# Altium footprint library Design III PCB Library.PcbLib: 98 footprints (part 1 of 7)
Each footprint in its own frame and in the unit in brackets; x right, y up, seen from the top. Pads: shape width x height; smd on the part's side, far side on the other; paste and mask are expansions set on the pad; w line width, h text height; cw(c..) or ccw(c..) is an arc to the next point about the centre after c.
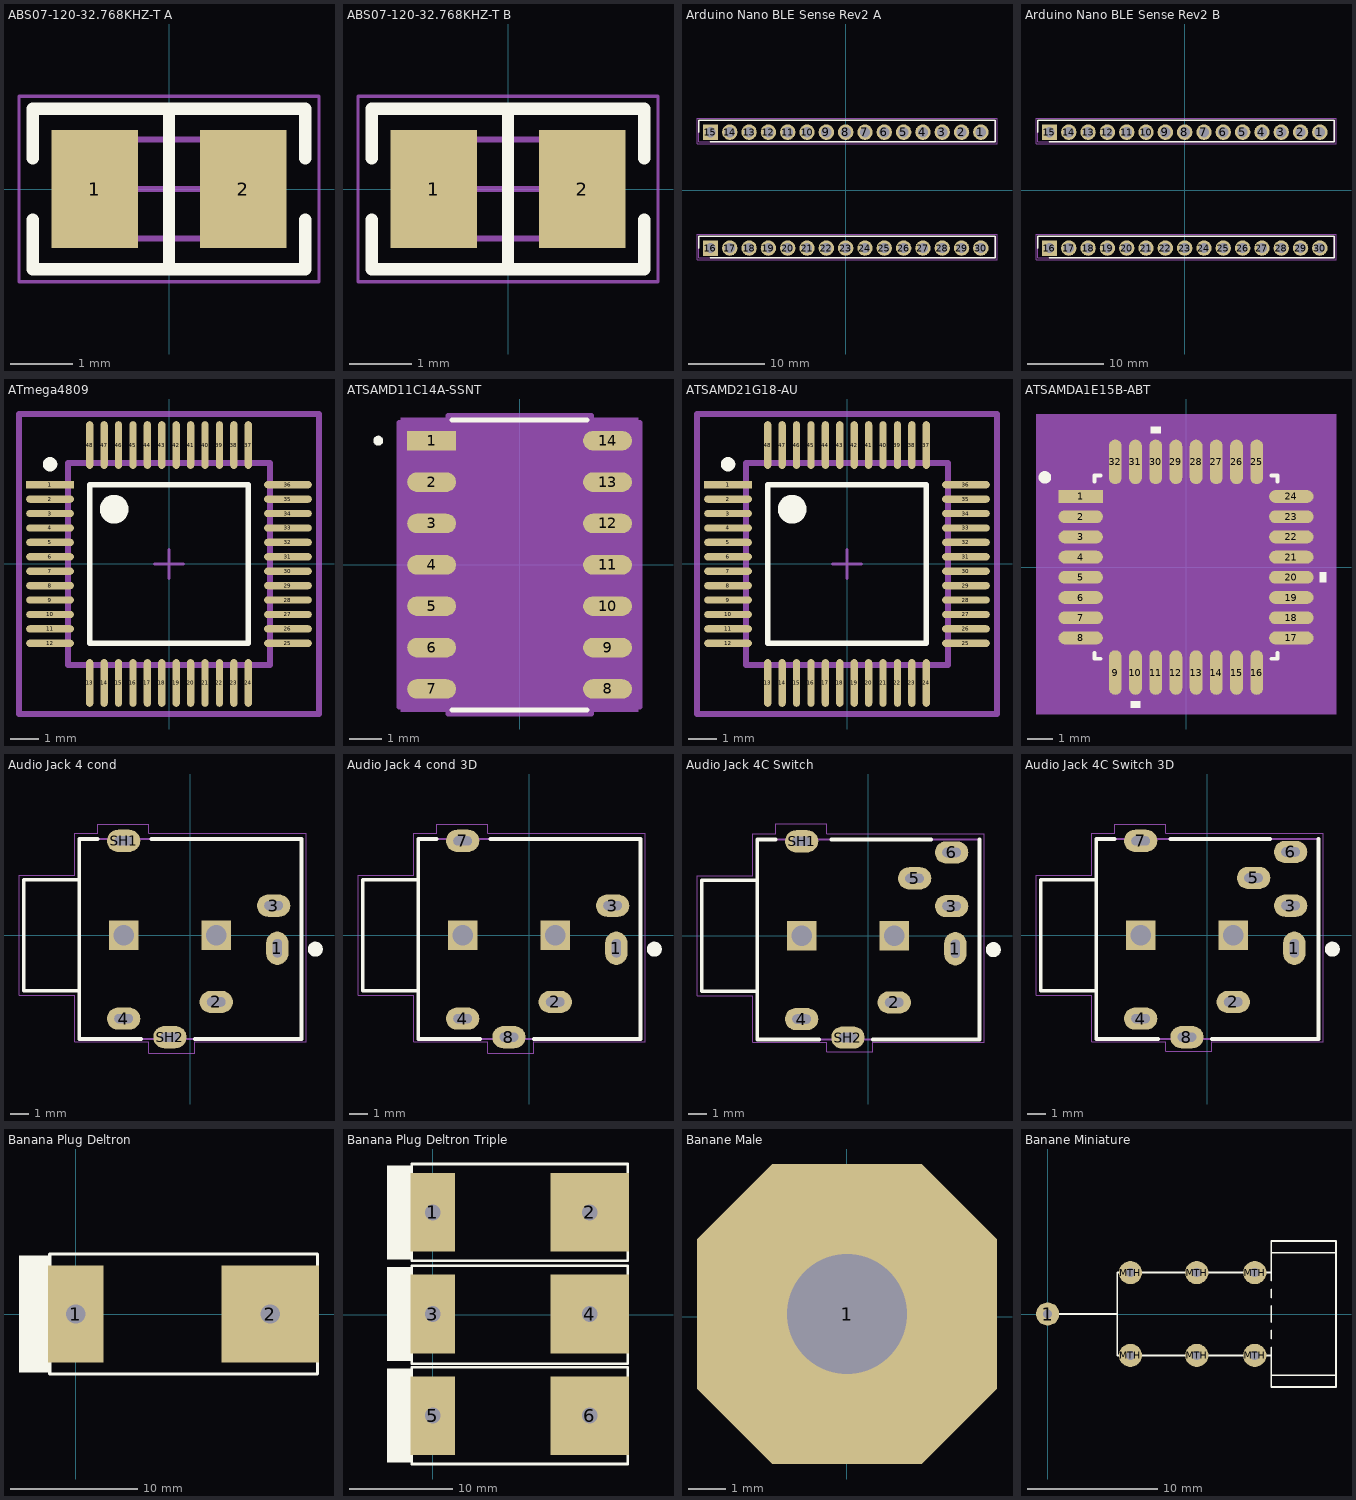
[diagram p0: the footprints below, top view; thin cyan lines are the x and y axes]

## ABS07-120-32.768KHZ-T A [mm] "32.768 kHz ±20ppm Crystal 6pF 55 kOhms 2-SMD, No Lead"
pads (2):
  rect 1.4x1.9 smd: 1(-1.2,0) 2(1.2,0)
Top Overlay:
  lines w0.2: -2.2,-0.5 -2.2,-1.3 2.2,-1.3 2.2,-0.5 ; -2.2,0.5 -2.2,1.3 2.2,1.3 2.2,0.5 ; 0,-1.3 0,1.3
Mechanical 13:
  lines w0.1: -1.65,-0.8 -1.65,0.8 1.65,0.8 1.65,-0.8 -1.65,-0.8
Mechanical 15:
  lines w0.05: -2.425,-1.5 2.425,-1.5 2.425,1.5 -2.425,1.5 -2.425,-1.5
  lines w0.1: -0.5,0 0.5,0 ; 0,-0.5 0,0.5
3D body "Crys_Abracon_ABS07-120-32_768KHZ-T_eec.STEP": height 0.25, standoff 0, extent -1.85,-1 1.85,1

## ABS07-120-32.768KHZ-T B [mm] "32.768 kHz ±20ppm Crystal 6pF 55 kOhms 2-SMD, No Lead"
pads (2):
  rect 1.4x1.9 smd: 1(-1.2,0) 2(1.2,0)
Top Overlay:
  lines w0.2: -2.2,-0.5 -2.2,-1.3 2.2,-1.3 2.2,-0.5 ; -2.2,0.5 -2.2,1.3 2.2,1.3 2.2,0.5 ; 0,-1.3 0,1.3
Mechanical 13:
  lines w0.1: -1.65,-0.8 1.65,-0.8 1.65,0.8 -1.65,0.8 -1.65,-0.8
Mechanical 15:
  lines w0.05: -2.425,-1.5 2.425,-1.5 2.425,1.5 -2.425,1.5 -2.425,-1.5
  lines w0.1: -0.5,0 0.5,0 ; 0,-0.5 0,0.5
3D body "Abracon ABS07.STEP": height 0.9, standoff 0, extent -1.625,-0.775 1.625,0.775

## Arduino Nano BLE Sense Rev2 A [mm] "ABX00069, nRF52840 64MHz, 256 KB SRAM, 1MB flash, 14 I/O pins, 8 Analog inputs"
pads (30):
  round 2.025 hole 1.35: 1(17.78,7.62) 2(15.24,7.62) 3(12.7,7.62) 4(10.16,7.62) 5(7.62,7.62) 6(5.08,7.62) 7(2.54,7.62) 8(0,7.62) 9(-2.54,7.62) 10(-5.08,7.62) 11(-7.62,7.62) 12(-10.16,7.62) 13(-12.7,7.62) 14(-15.24,7.62) 17(-15.24,-7.62) 18(-12.7,-7.62) 19(-10.16,-7.62) 20(-7.62,-7.62) 21(-5.08,-7.62) 22(-2.54,-7.62) 23(0,-7.62) 24(2.54,-7.62) 25(5.08,-7.62) 26(7.62,-7.62) 27(10.16,-7.62) 28(12.7,-7.62) 29(15.24,-7.62) 30(17.78,-7.62)
  rect 2.025x2.025 hole 1.35: 15(-17.78,7.62) 16(-17.78,-7.62)
Top Overlay:
  lines w0.2: -19.3,-7.62 -19.3,-6.05 19.65,-6.05 19.65,-8.89 -17.78,-8.89 ; -19.3,7.62 -19.3,9.19 19.65,9.19 19.65,6.35 -17.78,6.35
Mechanical 13:
  lines w0.1: -19.3,-8.89 -19.3,-6.05 19.65,-6.05 19.65,-8.89 -19.3,-8.89 ; -19.3,6.35 -19.3,9.19 19.65,9.19 19.65,6.35 -19.3,6.35
Mechanical 15:
  lines w0.05: -19.55,-9.14 -19.55,-5.8 19.9,-5.8 19.9,-9.14 -19.55,-9.14 ; -19.55,6.1 -19.55,9.44 19.9,9.44 19.9,6.1 -19.55,6.1
3D body "Arduino Nano BLE Sense Rev2.STEP": height 6.65, standoff -6.2, extent -23.06,-8.89 21.59,8.943

## Arduino Nano BLE Sense Rev2 B [mm] "ABX00069, nRF52840 64MHz, 256 KB SRAM, 1MB flash, 14 I/O pins, 8 Analog inputs"
pads (30):
  round 2.025 hole 1.35: 1(17.78,7.62) 2(15.24,7.62) 3(12.7,7.62) 4(10.16,7.62) 5(7.62,7.62) 6(5.08,7.62) 7(2.54,7.62) 8(0,7.62) 9(-2.54,7.62) 10(-5.08,7.62) 11(-7.62,7.62) 12(-10.16,7.62) 13(-12.7,7.62) 14(-15.24,7.62) 17(-15.24,-7.62) 18(-12.7,-7.62) 19(-10.16,-7.62) 20(-7.62,-7.62) 21(-5.08,-7.62) 22(-2.54,-7.62) 23(0,-7.62) 24(2.54,-7.62) 25(5.08,-7.62) 26(7.62,-7.62) 27(10.16,-7.62) 28(12.7,-7.62) 29(15.24,-7.62) 30(17.78,-7.62)
  rect 2.025x2.025 hole 1.35: 15(-17.78,7.62) 16(-17.78,-7.62)
Top Overlay:
  lines w0.2: -19.3,-7.62 -19.3,-6.05 19.65,-6.05 19.65,-8.89 -17.78,-8.89 ; -19.3,7.62 -19.3,9.19 19.65,9.19 19.65,6.35 -17.78,6.35
Mechanical 13:
  lines w0.1: -19.3,-8.89 -19.3,-6.05 19.65,-6.05 19.65,-8.89 -19.3,-8.89 ; -19.3,6.35 -19.3,9.19 19.65,9.19 19.65,6.35 -19.3,6.35
Mechanical 15:
  lines w0.05: -19.55,-9.14 -19.55,-5.8 19.9,-5.8 19.9,-9.14 -19.55,-9.14 ; -19.55,6.1 -19.55,9.44 19.9,9.44 19.9,6.1 -19.55,6.1

## ATmega4809 [mm] "AVR megaAVR® 0, Functional Safety (FuSa) Microcontroller IC 8-Bit 20MHz 48KB (24K x 16) FLASH 48-TQFP (7x7)"
pads (48):
  rect 1.655x0.252 smd paste+0 mask+0: 1(-4.125,2.75)
  rrect100% 1.655x0.252 smd paste+0 mask+0: 2(-4.125,2.25) 3(-4.125,1.75) 4(-4.125,1.25) 5(-4.125,0.75) 6(-4.125,0.25) 7(-4.125,-0.25) 8(-4.125,-0.75) 9(-4.125,-1.25) 10(-4.125,-1.75) 11(-4.125,-2.25) 12(-4.125,-2.75) 25(4.125,-2.75) 26(4.125,-2.25) 27(4.125,-1.75) 28(4.125,-1.25) 29(4.125,-0.75) 30(4.125,-0.25) 31(4.125,0.25) 32(4.125,0.75) 33(4.125,1.25) 34(4.125,1.75) 35(4.125,2.25) 36(4.125,2.75)
  rrect100% 0.252x1.655 smd paste+0 mask+0: 13(-2.75,-4.125) 14(-2.25,-4.125) 15(-1.75,-4.125) 16(-1.25,-4.125) 17(-0.75,-4.125) 18(-0.25,-4.125) 19(0.25,-4.125) 20(0.75,-4.125) 21(1.25,-4.125) 22(1.75,-4.125) 23(2.25,-4.125) 24(2.75,-4.125) 37(2.75,4.125) 38(2.25,4.125) 39(1.75,4.125) 40(1.25,4.125) 41(0.75,4.125) 42(0.25,4.125) 43(-0.25,4.125) 44(-0.75,4.125) 45(-1.25,4.125) 46(-1.75,4.125) 47(-2.25,4.125) 48(-2.75,4.125)
Top Overlay:
  circle w0.25: c-4.125,3.46 r0.125
  circle w0.5: c-1.9,1.9 r0.25
  lines w0.2: -2.75,-2.75 2.75,-2.75 2.75,2.75 -2.75,2.75 -2.75,-2.75
Top Assembly:
  lines w0.2: -5.203,-5.203 5.203,-5.203 5.203,5.203 -5.203,5.203 -5.203,-5.203
Top Courtyard:
  lines w0.2: -5.203,-5.203 5.203,-5.203 5.203,5.203 -5.203,5.203 -5.203,-5.203
Board:
  lines w0.2: -3.5,-3.5 3.5,-3.5 3.5,3.5 -3.5,3.5 -3.5,-3.5
Top Component Center:
  lines w0.1: -0.5,0 0.5,0 ; 0,-0.5 0,0.5
3D body "IC_Microchip_PIC24FJ256GA705-I-PT_eec.STEP": height 0.25, standoff 0, extent -5.203,-5.203 5.203,5.203

## ATSAMD11C14A-SSNT [mm] "ARM® Cortex®-M0+ SAM D11C Microcontroller IC 32-Bit Single-Core 48MHz 16KB (16K x 8) FLASH 14-SOIC"
pads (14):
  rect 1.5x0.6 smd paste+0 mask+0: 1(-2.7,3.81)
  oval 1.5x0.6 smd paste+0 mask+0: 2(-2.7,2.54) 3(-2.7,1.27) 4(-2.7,0) 5(-2.7,-1.27) 6(-2.7,-2.54) 7(-2.7,-3.81) 8(2.7,-3.81) 9(2.7,-2.54) 10(2.7,-1.27) 11(2.7,0) 12(2.7,1.27) 13(2.7,2.54) 14(2.7,3.81)
Top Overlay:
  circle w0.152: c-4.339,3.81 r0.076
  lines w0.152: -2.077,-4.452 2.077,-4.452 ; -2.077,4.452 2.077,4.452
Mechanical 5:
  region: 3.641,-4.516 -3.641,-4.516 -3.641,4.516 3.641,4.516
Mechanical 13:
  circle w0: c-1.696,3.81 r0.038
  lines w0: -0.305,4.325 ccw(c0,4.325) 0.305,4.325
  lines w0.025: -1.95,-4.325 1.95,-4.325 1.95,4.325 -1.95,4.325 -1.95,-4.325
Mechanical 15:
  region: -2.204,-4.364 -3.704,-4.364 -3.704,4.364 -2.204,4.364 -2.204,4.579 2.204,4.579 2.204,4.364 3.704,4.364 3.704,-4.364 2.204,-4.364 2.204,-4.579 -2.204,-4.579
  lines w0.152: -3.704,-4.364 -3.704,4.364 -2.204,4.364 -2.204,4.579 2.204,4.579 2.204,4.364 3.704,4.364 3.704,-4.364 2.204,-4.364 2.204,-4.579 -2.204,-4.579 -2.204,-4.364 -3.704,-4.364
3D body "SOIC14_SL_MCH.step": height 1.75, standoff 0, extent -3.1,-4.325 3.1,4.325

## ATSAMD21G18-AU [mm] "ARM® Cortex®-M0+ SAM D21G, Functional Safety (FuSa) Microcontroller IC 32-Bit Single-Core 48MHz 256KB (256K x 8) FLASH 48-TQFP (7x7)"
pads (48):
  rect 1.655x0.252 smd paste+0 mask+0: 1(-4.125,2.75)
  rrect100% 1.655x0.252 smd paste+0 mask+0: 2(-4.125,2.25) 3(-4.125,1.75) 4(-4.125,1.25) 5(-4.125,0.75) 6(-4.125,0.25) 7(-4.125,-0.25) 8(-4.125,-0.75) 9(-4.125,-1.25) 10(-4.125,-1.75) 11(-4.125,-2.25) 12(-4.125,-2.75) 25(4.125,-2.75) 26(4.125,-2.25) 27(4.125,-1.75) 28(4.125,-1.25) 29(4.125,-0.75) 30(4.125,-0.25) 31(4.125,0.25) 32(4.125,0.75) 33(4.125,1.25) 34(4.125,1.75) 35(4.125,2.25) 36(4.125,2.75)
  rrect100% 0.252x1.655 smd paste+0 mask+0: 13(-2.75,-4.125) 14(-2.25,-4.125) 15(-1.75,-4.125) 16(-1.25,-4.125) 17(-0.75,-4.125) 18(-0.25,-4.125) 19(0.25,-4.125) 20(0.75,-4.125) 21(1.25,-4.125) 22(1.75,-4.125) 23(2.25,-4.125) 24(2.75,-4.125) 37(2.75,4.125) 38(2.25,4.125) 39(1.75,4.125) 40(1.25,4.125) 41(0.75,4.125) 42(0.25,4.125) 43(-0.25,4.125) 44(-0.75,4.125) 45(-1.25,4.125) 46(-1.75,4.125) 47(-2.25,4.125) 48(-2.75,4.125)
Top Overlay:
  circle w0.25: c-4.125,3.46 r0.125
  circle w0.5: c-1.9,1.9 r0.25
  lines w0.2: -2.75,-2.75 2.75,-2.75 2.75,2.75 -2.75,2.75 -2.75,-2.75
Top Assembly:
  lines w0.2: -5.203,-5.203 5.203,-5.203 5.203,5.203 -5.203,5.203 -5.203,-5.203
Top 3D Body:
  lines w0.2: -3.5,-3.5 3.5,-3.5 3.5,3.5 -3.5,3.5 -3.5,-3.5
Top Courtyard:
  lines w0.2: -5.203,-5.203 5.203,-5.203 5.203,5.203 -5.203,5.203 -5.203,-5.203
Top Component Center:
  lines w0.1: -0.5,0 0.5,0 ; 0,-0.5 0,0.5
3D body "IC_Microchip_PIC24FJ256GA705-I-PT_eec.STEP": height 0.25, standoff 0, extent -5.203,-5.203 5.203,5.203

## ATSAMDA1E15B-ABT [mm]
pads (32):
  rect 1.762x0.507 smd paste+0 mask+0: 1(-4.169,2.8)
  oval 1.762x0.507 smd paste+0 mask+0: 2(-4.169,2) 3(-4.169,1.2) 4(-4.169,0.4) 5(-4.169,-0.4) 6(-4.169,-1.2) 7(-4.169,-2) 8(-4.169,-2.8) 17(4.169,-2.8) 18(4.169,-2) 19(4.169,-1.2) 20(4.169,-0.4) 21(4.169,0.4) 22(4.169,1.2) 23(4.169,2) 24(4.169,2.8)
  oval 0.507x1.762 smd paste+0 mask+0: 9(-2.8,-4.169) 10(-2,-4.169) 11(-1.2,-4.169) 12(-0.4,-4.169) 13(0.4,-4.169) 14(1.2,-4.169) 15(2,-4.169) 16(2.8,-4.169) 25(2.8,4.169) 26(2,4.169) 27(1.2,4.169) 28(0.4,4.169) 29(-0.4,4.169) 30(-1.2,4.169) 31(-2,4.169) 32(-2.8,4.169)
Top Overlay:
  circle w0.25: c-5.588,3.556 r0.125
  region: -1.81,-5.304 -2.191,-5.304 -2.191,-5.558 -1.81,-5.558
  region: 5.304,-0.209 5.558,-0.209 5.558,-0.59 5.304,-0.59
  region: -1.01,5.304 -1.391,5.304 -1.391,5.558 -1.01,5.558
  lines w0.152: -3.627,-3.386 -3.627,-3.627 -3.386,-3.627 ; -3.627,3.386 -3.627,3.627 -3.386,3.627 ; 3.386,-3.627 3.627,-3.627 3.627,-3.386 ; 3.386,3.627 3.627,3.627 3.627,3.386
Mechanical 5:
  region: 5.939,-5.812 -5.939,-5.812 -5.939,6.066 5.939,6.066
Mechanical 13:
  lines w0.025: -3.5,2.23 -2.23,3.5 ; -4.5,-3.029 -4.5,-2.571 -3.5,-2.571 -3.5,-3.029 -4.5,-3.029 ; -4.5,-2.229 -4.5,-1.771 -3.5,-1.771 -3.5,-2.229 -4.5,-2.229 ; -4.5,-1.429 -4.5,-0.971 -3.5,-0.971 -3.5,-1.429 -4.5,-1.429 ; -4.5,-0.629 -4.5,-0.171 -3.5,-0.171 -3.5,-0.629 -4.5,-0.629 ; -4.5,0.171 -4.5,0.629 -3.5,0.629 -3.5,0.171 -4.5,0.171 ; -4.5,0.971 -4.5,1.429 -3.5,1.429 -3.5,0.971 -4.5,0.971 ; -4.5,1.771 -4.5,2.229 -3.5,2.229 -3.5,1.771 -4.5,1.771 ; -4.5,2.571 -4.5,3.029 -3.5,3.029 -3.5,2.571 -4.5,2.571 ; -3.5,-3.5 -3.5,3.5 3.5,3.5 3.5,-3.5 -3.5,-3.5 ; -3.029,-4.5 -3.029,-3.5 -2.571,-3.5 -2.571,-4.5 -3.029,-4.5 ; -3.029,3.5 -2.571,3.5 -2.571,4.5 -3.029,4.5 -3.029,3.5 ; -2.229,-4.5 -2.229,-3.5 -1.771,-3.5 -1.771,-4.5 -2.229,-4.5 ; -2.229,3.5 -1.771,3.5 -1.771,4.5 -2.229,4.5 -2.229,3.5 ; -1.429,-4.5 -1.429,-3.5 -0.971,-3.5 -0.971,-4.5 -1.429,-4.5 ; -1.429,3.5 -0.971,3.5 -0.971,4.5 -1.429,4.5 -1.429,3.5 ; -0.629,-4.5 -0.629,-3.5 -0.171,-3.5 -0.171,-4.5 -0.629,-4.5 ; -0.629,3.5 -0.171,3.5 -0.171,4.5 -0.629,4.5 -0.629,3.5 ; 0.171,-4.5 0.171,-3.5 0.629,-3.5 0.629,-4.5 0.171,-4.5 ; 0.171,3.5 0.629,3.5 0.629,4.5 0.171,4.5 0.171,3.5 ; 0.971,-4.5 0.971,-3.5 1.429,-3.5 1.429,-4.5 0.971,-4.5 ; 0.971,3.5 1.429,3.5 1.429,4.5 0.971,4.5 0.971,3.5 ; 1.771,-4.5 1.771,-3.5 2.229,-3.5 2.229,-4.5 1.771,-4.5 ; 1.771,3.5 2.229,3.5 2.229,4.5 1.771,4.5 1.771,3.5 ; 2.571,-4.5 2.571,-3.5 3.029,-3.5 3.029,-4.5 2.571,-4.5 ; 2.571,3.5 3.029,3.5 3.029,4.5 2.571,4.5 2.571,3.5 ; 3.5,-3.029 3.5,-2.571 4.5,-2.571 4.5,-3.029 3.5,-3.029 ; 3.5,-2.229 3.5,-1.771 4.5,-1.771 4.5,-2.229 3.5,-2.229 ; 3.5,-1.429 3.5,-0.971 4.5,-0.971 4.5,-1.429 3.5,-1.429 ; 3.5,-0.629 3.5,-0.171 4.5,-0.171 4.5,-0.629 3.5,-0.629 ; 3.5,0.171 3.5,0.629 4.5,0.629 4.5,0.171 3.5,0.171 ; 3.5,0.971 3.5,1.429 4.5,1.429 4.5,0.971 3.5,0.971 ; 3.5,1.771 3.5,2.229 4.5,2.229 4.5,1.771 3.5,1.771 ; 3.5,2.571 3.5,3.029 4.5,3.029 4.5,2.571 3.5,2.571
  text "*" at -3.436,2.565 h1.27
Mechanical 15:
  region: -3.562,-4.008 -4.008,-4.008 -4.008,-3.562 -5.558,-3.562 -5.558,3.562 -4.008,3.562 -4.008,4.008 -3.562,4.008 -3.562,5.558 3.562,5.558 3.562,4.008 4.008,4.008 4.008,3.562 5.558,3.562 5.558,-3.562 4.008,-3.562 4.008,-4.008 3.562,-4.008 3.562,-5.558 -3.562,-5.558
  lines w0.152: -5.558,-3.562 -4.008,-3.562 -4.008,-4.008 -3.562,-4.008 -3.562,-5.558 3.562,-5.558 3.562,-4.008 4.008,-4.008 4.008,-3.562 5.558,-3.562 5.558,3.562 4.008,3.562 4.008,4.008 3.562,4.008 3.562,5.558 -3.562,5.558 -3.562,4.008 -4.008,4.008 -4.008,3.562 -5.558,3.562 -5.558,-3.562
3D body "TQFP32_MC_MCH.step": height 1.2, standoff 0, extent -4.5,-4.5 4.5,4.5

## Audio Jack 4 cond [mm]
pads (8):
  oval 1.2x1.8 hole 0.5 slot 1 at 90 deg: 1(4.7,-0.7)
  oval 1.8x1.2 hole 0.5 slot 1 at 0 deg: 2(1.4,-3.6) 3(4.5,1.6) 4(-3.6,-4.5) SH1(-3.6,5.1) SH2(-1.1,-5.5)
  rect 1.6x1.6 hole 1.1: ""(-3.6,0) ""(1.4,0)
Top Overlay:
  circle w0.41: c6.75,-0.75 r0.2
  lines w0.2: -5,5.2 -6,5.2 -6,3 ; -2.65,-5.6 -6,-5.6 -6,-3 ; -2.1,5.2 6,5.2 6,-5.6 0.25,-5.6 ; -6,-3 -9,-3 -9,3 -6,3 ; -6,-3 -6,3
Mechanical 13:
  lines w0.127: -6,-3 -9,-3 -9,3 -6,3 ; -6,-3 -6,3 ; -6,-3 -6,-5.6 6,-5.6 6,5.2 -6,5.2 -6,3
Mechanical 15:
  lines w0.05: -9.25,-3.25 -9.25,3.25 -6.25,3.25 -6.25,5.5 -5,5.5 -5,6 -2.25,6 -2.25,5.5 6.25,5.5 6.25,-5.75 0.25,-5.75 0.25,-6.375 -2.25,-6.375 -2.25,-5.75 -6.25,-5.75 -6.25,-3.25 -9.25,-3.25

## Audio Jack 4 cond 3D [mm]
pads (8):
  oval 1.2x1.8 hole 0.5 slot 1 at 90 deg: 1(4.7,-0.7)
  oval 1.8x1.2 hole 0.5 slot 1 at 0 deg: 2(1.4,-3.6) 3(4.5,1.6) 4(-3.6,-4.5) 7(-3.6,5.1) 8(-1.1,-5.5)
  rect 1.6x1.6 hole 1.1: ""(-3.6,0) ""(1.4,0)
Top Overlay:
  circle w0.41: c6.75,-0.75 r0.2
  lines w0.2: -5,5.2 -6,5.2 -6,3 ; -2.65,-5.6 -6,-5.6 -6,-3 ; -2.1,5.2 6,5.2 6,-5.6 0.25,-5.6 ; -6,-3 -6,3 ; -6,-3 -9,-3 -9,3 -6,3
Mechanical 13:
  lines w0.127: -6,-3 -6,-5.6 6,-5.6 6,5.2 -6,5.2 -6,3 ; -6,-3 -6,3 ; -6,-3 -9,-3 -9,3 -6,3
Mechanical 15:
  lines w0.05: -9.25,-3.25 -6.25,-3.25 -6.25,-5.75 -2.25,-5.75 -2.25,-6.375 0.25,-6.375 0.25,-5.75 6.25,-5.75 6.25,5.5 -2.25,5.5 -2.25,6 -5,6 -5,5.5 -6.25,5.5 -6.25,3.25 -9.25,3.25 -9.25,-3.25
3D body "CUI_DEVICES_SJ-435107.step": height 8.3, standoff -2.4, extent -9,-5.85 6,5.45

## Audio Jack 4C Switch [mm]
pads (10):
  oval 1.2x1.8 hole 0.5 slot 1 at 90 deg: 1(4.7,-0.7)
  oval 1.8x1.2 hole 0.5 slot 1 at 0 deg: 2(1.4,-3.6) 3(4.5,1.6) 4(-3.6,-4.5) 5(2.5,3.1) 6(4.5,4.5) SH1(-3.6,5.1) SH2(-1.1,-5.5)
  rect 1.6x1.6 hole 1.1: ""(-3.6,0) ""(1.4,0)
Top Overlay:
  circle w0.41: c6.75,-0.75 r0.2
  lines w0.2: -5,5.2 -6,5.2 -6,3 ; -2.65,-5.6 -6,-5.6 -6,-3 ; -2,5.2 3.4,5.2 ; 0.25,-5.6 6,-5.6 6,5.2 ; -6,-3 -6,3 ; -6,-3 -9,-3 -9,3 -6,3
Mechanical 13:
  lines w0.127: -6,-3 -6,-5.6 6,-5.6 6,5.2 -6,5.2 -6,3 ; -6,-3 -6,3 ; -6,-3 -9,-3 -9,3 -6,3
Mechanical 15:
  lines w0.05: -9.25,-3.25 -6.25,-3.25 -6.25,-5.75 -2.25,-5.75 -2.25,-6.25 0.25,-6.25 0.25,-5.75 6.25,-5.75 6.25,5.5 -2.25,5.5 -2.25,6.05 -5,6.05 -5,5.5 -6.25,5.5 -6.25,3.25 -9.25,3.25 -9.25,-3.25

## Audio Jack 4C Switch 3D [mm]
pads (10):
  oval 1.2x1.8 hole 0.5 slot 1 at 90 deg: 1(4.7,-0.7)
  oval 1.8x1.2 hole 0.5 slot 1 at 0 deg: 2(1.4,-3.6) 3(4.5,1.6) 4(-3.6,-4.5) 5(2.5,3.1) 6(4.5,4.5) 7(-3.6,5.1) 8(-1.1,-5.5)
  rect 1.6x1.6 hole 1.1: ""(-3.6,0) ""(1.4,0)
Top Overlay:
  circle w0.41: c6.75,-0.75 r0.2
  lines w0.2: -5,5.2 -6,5.2 -6,3 ; -2.65,-5.6 -6,-5.6 -6,-3 ; -2,5.2 3.4,5.2 ; 0.25,-5.6 6,-5.6 6,5.2 ; -6,-3 -6,3 ; -6,-3 -9,-3 -9,3 -6,3
Mechanical 13:
  lines w0.127: -6,-3 -6,-5.6 6,-5.6 6,5.2 -6,5.2 -6,3 ; -6,-3 -6,3 ; -6,-3 -9,-3 -9,3 -6,3
Mechanical 15:
  lines w0.05: -9.25,-3.25 -6.25,-3.25 -6.25,-5.75 -2.25,-5.75 -2.25,-6.25 0.25,-6.25 0.25,-5.75 6.25,-5.75 6.25,5.5 -2.25,5.5 -2.25,6 -5,6 -5,5.5 -6.25,5.5 -6.25,3.25 -9.25,3.25 -9.25,-3.25
3D body "CUI_DEVICES_SJ-435107RS.step": height 8.3, standoff -2.4, extent -9,-5.85 6,5.45

## Banana Plug Deltron [mil] "Banana Plug Deltron"
pads (2):
  rect 170x300 hole 60: 1(0,0)
  rect 300x300 hole 60: 2(600,0)
Top Overlay:
  rectangle: -175,-180 -80,180
  lines w10: -80,-185 -80,185 745,185 745,-185 -80,-185
3D body: height 490, standoff 130, extent -175,-180 -75,180
3D body: height 500, standoff 5, extent -85,-190 750,190

## Banana Plug Deltron Triple [mil] "Banana Plug Deltron Triple"
pads (6):
  rect 170x300 hole 60: 1(0,390.56) 3(0,2.56) 5(0,-385.44)
  rect 300x300 hole 60: 2(600,390.56) 4(600,2.56) 6(600,-385.44)
Top Overlay:
  rectangle: -175,210.56 -80,570.56
  rectangle: -175,-565.44 -80,-205.44
  rectangle: -175,-177.44 -80,182.56
  lines w10: -80,-570.44 745,-570.44 745,-200.44 -80,-200.44 -80,-570.44 ; -80,-187.44 -80,187.56 745,187.56 745,-187.44 -80,-187.44 ; -80,205.56 745,205.56 745,575.56 -80,575.56 -80,205.56
3D body: height 200, standoff 0, extent -29.76,-415.38 30.01,-355.5
3D body: height 200, standoff 0, extent 570.25,360.63 630.01,420.51
3D body: height 200, standoff 0, extent 570.24,-27.38 630.01,32.5
3D body: height 200, standoff 0, extent 570.25,-415.37 630.01,-355.49
3D body: height 200, standoff 0, extent -29.76,360.62 30,420.5
3D body: height 200, standoff 0, extent -29.76,-27.38 30,32.5
3D body: height 500, standoff 5, extent -85,-577.44 750,-193.44
3D body: height 490, standoff 130, extent -175,-565.44 -85,-205.44
3D body: height 500, standoff 5, extent -85,198.56 750,582.56
3D body: height 490, standoff 130, extent -175,210.56 -85,570.56
3D body: height 490, standoff 130, extent -175,-177.44 -85,182.56
3D body: height 500, standoff 5, extent -85,-189.44 750,194.56

## Banane Male [mil] "Johnson 108-0753-001"
pads (1):
  oct 312x312 hole 125: 1(0.21,3.03)
3D body: height 100, standoff 5, extent -155.79,-152.97 156.21,159.03
3D body: height 445, standoff 175, extent -133.49,-131.4 135.21,137.46
3D body: height 315, standoff 100, extent -133.72,-131.7 135.21,137.76
3D body: height 900, standoff 400, extent -79.16,-76.81 80.21,82.87
3D body: height 980, standoff 820, extent -79.01,-76.62 80.22,82.69

## Banane Miniature [mil] "Banane Miniature"
pads (7):
  round 70 hole 27.6: 1(0.02,1.07) MTH(250.02,-123.93) MTH(250.02,126.07) MTH(450.02,-123.93) MTH(450.02,126.07) MTH(625.02,-123.93) MTH(625.02,126.07)
Top Overlay:
  lines w5: 0.02,1.07 210.02,1.07 ; 675.02,-183.93 870.02,-183.93 ; 675.02,-98.93 675.02,-123.93 ; 675.02,-73.93 675.02,-48.93 ; 675.02,-23.93 675.02,26.07 ; 675.02,51.07 675.02,76.07 ; 675.02,101.07 675.02,126.07 ; 675.02,186.07 870.02,186.07 ; 675.02,-123.93 675.02,-218.93 870.02,-218.93 870.02,221.07 675.02,221.07 675.02,126.07 ; 675.02,-123.93 210.02,-123.93 210.02,126.07 675.02,126.07
3D body "User Library-Bananajack red.STEP": height 349.09, standoff -89.09, extent -69.98,-218.03 868.21,220.16